# Altium footprint library Connectors.PcbLib: 135 footprints (part 7 of 9)
Each footprint in its own frame and in the unit in brackets; x right, y up, seen from the top. Pads: shape width x height; smd on the part's side, far side on the other; paste and mask are expansions set on the pad; w line width, h text height; cw(c..) or ccw(c..) is an arc to the next point about the centre after c.
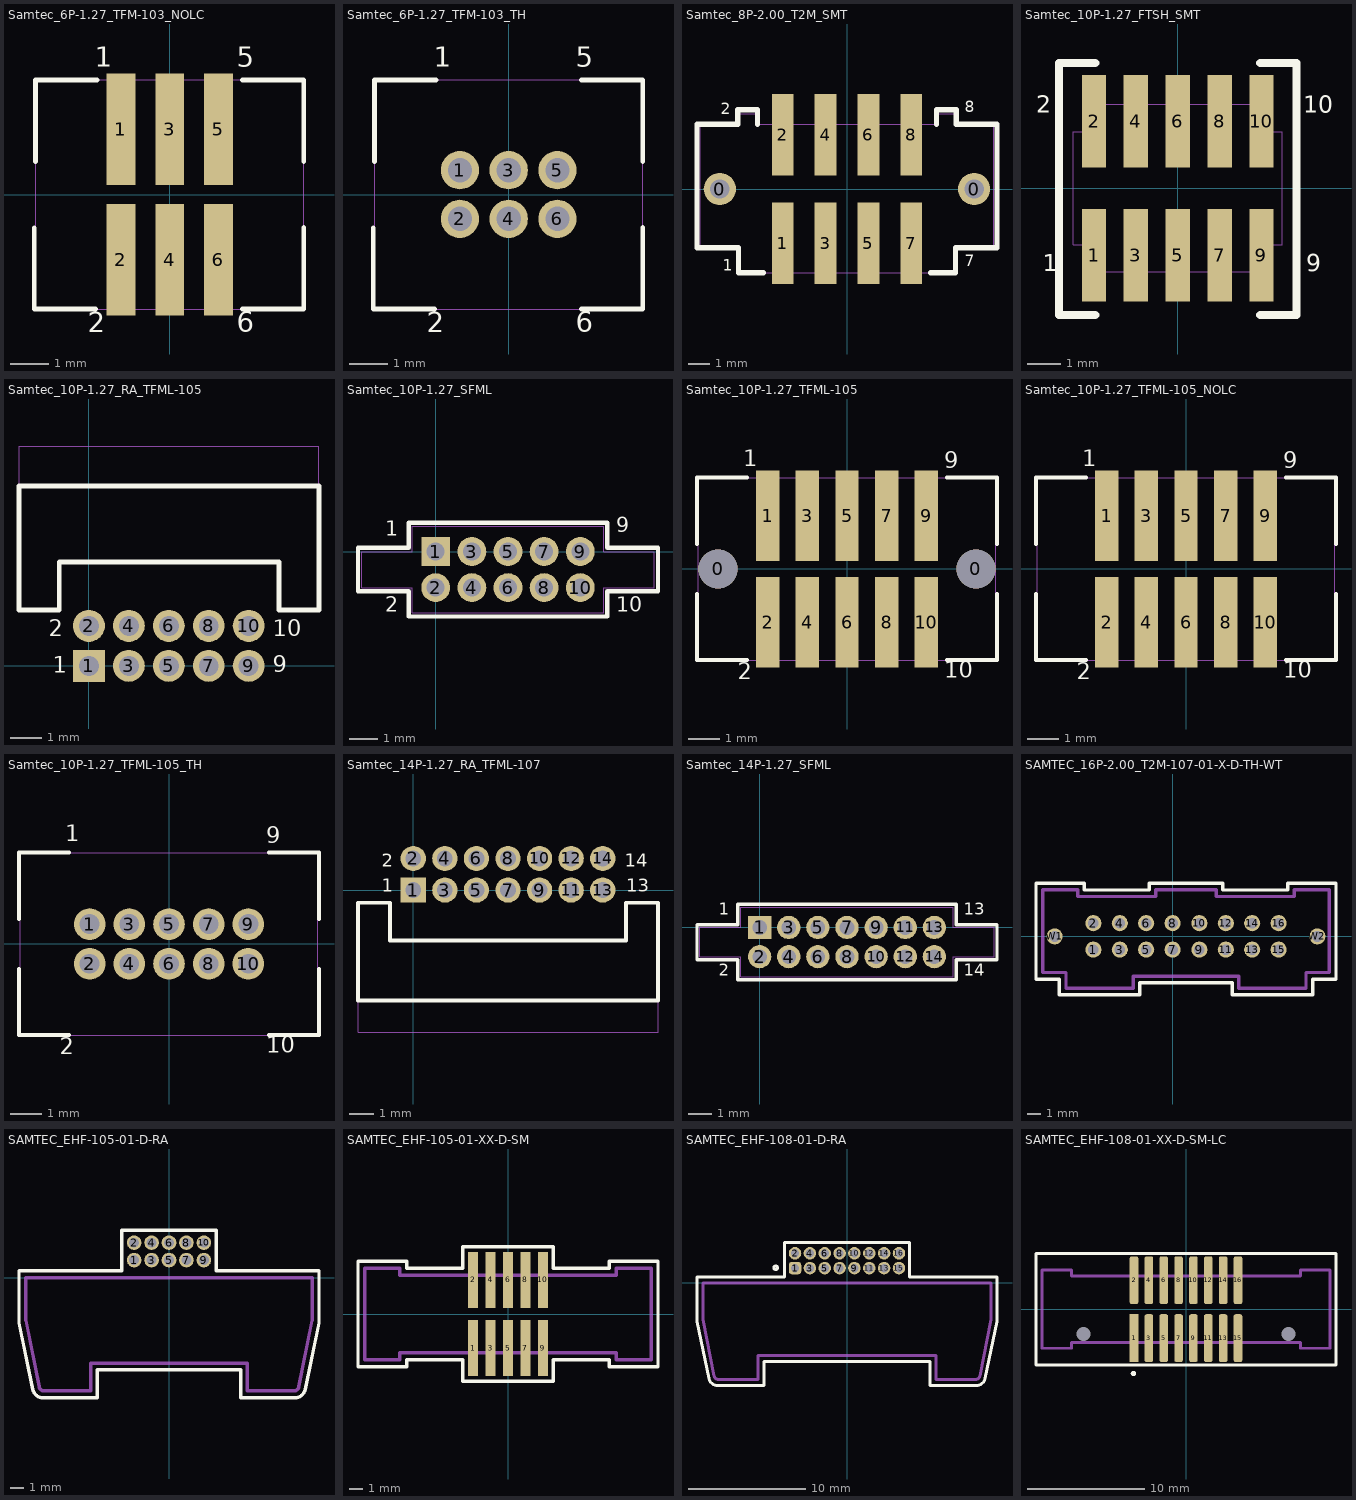
[diagram p6: the footprints below, top view; thin cyan lines are the x and y axes]

## Samtec_6P-1.27_TFM-103_NOLC [mm] "Connector Header 6pos dual row 1.27mmp surface mount No locking clip"
height 4.572
pads (6):
  rect 0.75x2.9 smd: 1(-1.27,1.7) 2(-1.27,-1.7) 3(0,1.7) 4(0,-1.7) 5(1.27,1.7) 6(1.27,-1.7)
Top Overlay:
  lines w0.127: -3.53,-0.864 -3.53,-2.985 -1.93,-2.985 ; -3.492,0.864 -3.492,2.985 -1.892,2.985 ; 1.893,-2.984 3.493,-2.984 3.493,-0.863 ; 1.893,2.985 3.493,2.985 3.493,0.864
  text "1" at -1.947,3.152 h0.9
  text "5" at 1.74,3.143 h0.9
  text "6" at 1.74,-3.751 h0.9
  text "2" at -2.13,-3.764 h0.9
Mechanical 1:
  lines w0.025: -3.492,-2.984 -3.492,2.985 3.493,2.985 3.493,-2.984 -3.492,-2.984
  text "2" at -2.148,-3.788 h1
  text "6" at 1.74,-3.751 h1
  text "5" at 1.74,3.143 h1
  text "1" at -1.947,3.152 h1
  text ".Designator" at -1.2,-0.3 h1.52
3D body "Samtec-TFM-103-02-L-D-LC.stp": height 5.59, standoff -1.27, extent -3.492,-2.984 3.493,2.985

## Samtec_6P-1.27_TFM-103_TH [mm] "Connector Header 6pos dual row 1.27mmp Through Hole No Locking clip"
height 4.572
pads (6):
  round 1 hole 0.635: 1(-1.27,0.635) 2(-1.27,-0.635) 3(0,0.635) 4(0,-0.635) 5(1.27,0.635) 6(1.27,-0.635)
Top Overlay:
  lines w0.127: -3.53,-0.864 -3.53,-2.985 -1.93,-2.985 ; -3.492,0.864 -3.492,2.985 -1.892,2.985 ; 1.893,-2.984 3.493,-2.984 3.493,-0.863 ; 1.893,2.985 3.493,2.985 3.493,0.864
  text "2" at -2.13,-3.764 h0.9
  text "6" at 1.74,-3.751 h0.9
  text "5" at 1.74,3.143 h0.9
  text "1" at -1.947,3.152 h0.9
Mechanical 1:
  lines w0.025: -3.492,-2.984 3.493,-2.984 3.493,2.985 -3.492,2.985 -3.492,-2.984
  text ".Designator" at -1.2,-0.3 h1.52
  text "1" at -1.947,3.152 h1
  text "5" at 1.74,3.143 h1
  text "6" at 1.74,-3.751 h1
  text "2" at -2.148,-3.788 h1
3D body "Samtec-TFM-103-01-L-D.stp": height 5.59, standoff -1.98, extent -3.492,-2.857 3.493,2.858

## Samtec_8P-2.00_T2M_SMT [mm] "Connector Header 8pos dual row 2.0mmp SMT"
height 4.572
pads (10):
  round 1.5 hole 0.9: 0(-5.935,0) 0(5.935,0)
  rect 1.02x3.8 smd: 1(-3,-2.535) 2(-3,2.535) 3(-1,-2.535) 4(-1,2.535) 5(1,-2.535) 6(1,2.535) 7(3,-2.535) 8(3,2.535)
Top Overlay:
  lines w0.25: -4.177,3.015 -4.177,3.7 -5.1,3.7 -5.1,3.015 -7,3.015 -7,-2.735 -5.065,-2.735 -5.065,-3.915 -3.9,-3.915 ; 3.9,-3.915 5.065,-3.915 5.065,-2.735 7,-2.735 7,3.015 5.1,3.015 5.1,3.7 4.177,3.7 4.177,3.015
  text "2" at -5.9,3.3 h0.9
  text "8" at 5.5,3.4 h0.9
  text "7" at 5.5,-3.8 h0.9
  text "1" at -5.8,-4 h0.9
Mechanical 1:
  lines w0.025: -6.837,-2.735 -6.837,3.015 -5.066,3.015 -5.066,3.523 -4.177,3.523 -4.177,3.015 4.177,3.015 4.177,3.523 5.066,3.523 5.066,3.015 6.837,3.015 6.837,-2.735 5.064,-2.735 5.064,-3.915 -5.065,-3.915 -5.065,-2.735 -6.837,-2.735 ; -3.3,-4.2 -2.7,-4.2 -2.7,-0.9 -3.3,-0.9 -3.3,-4.2 ; -3.3,0.87 -3.3,4.17 -2.7,4.17 -2.7,0.87 -3.3,0.87 ; -1.3,-4.2 -1.3,-0.9 -0.7,-0.9 -0.7,-4.2 -1.3,-4.2 ; -1.3,0.87 -1.3,4.17 -0.7,4.17 -0.7,0.87 -1.3,0.87 ; 0.7,-4.2 0.7,-0.9 1.3,-0.9 1.3,-4.2 0.7,-4.2 ; 0.7,0.87 0.7,4.17 1.3,4.17 1.3,0.87 0.7,0.87 ; 2.7,-4.2 2.7,-0.9 3.3,-0.9 3.3,-4.2 2.7,-4.2 ; 2.7,0.87 2.7,4.17 3.3,4.17 3.3,0.87 2.7,0.87
  text ".Designator" at -2.3,-0.6 h1
  text "1" at -4.2,-2.8 h1
  text "7" at 3.8,-2.8 h1
  text "8" at 3.7,2.2 h1
  text "2" at -4.2,2.1 h1
3D body "Samtec-T2M-104-01-L-D-SM-K-TR-WT.stp": height 6.68, standoff -1.65, extent -6.837,-4.313 6.837,4.314

## Samtec_10P-1.27_FTSH_SMT [mm] "Connector Header 10pos dual row 1.27mmp SMT"
height 4.572
pads (10):
  rect 0.74x2.8 smd: 1(-2.54,-2.03) 2(-2.54,2.03) 3(-1.27,-2.03) 4(-1.27,2.03) 5(0,-2.03) 6(0,2.03) 7(1.27,-2.03) 8(1.27,2.03) 9(2.54,-2.03) 10(2.54,2.03)
Top Overlay:
  lines w0.25: -2.5,-3.85 -3.6,-3.85 -3.6,3.8 -2.5,3.8 ; 2.5,-3.85 3.6,-3.85 3.6,3.8 2.5,3.8
  text "1" at -4.1,-2.7 h0.9
  text "9" at 3.9,-2.7 h0.9
  text "10" at 3.8,2.1 h0.9
  text "2" at -4.3,2.1 h0.9
Mechanical 1:
  lines w0.025: -3.175,-1.715 -2.54,-1.715 -2.54,-2.54 2.54,-2.54 2.54,-1.715 3.175,-1.715 3.175,1.714 2.54,1.714 2.54,2.54 -2.54,2.54 -2.54,1.714 -3.175,1.714 -3.175,-1.715 ; -2.8,-2.77 -2.8,-1.07 -2.3,-1.07 -2.3,-2.77 -2.8,-2.77 ; -2.8,1.07 -2.3,1.07 -2.3,2.77 -2.8,2.77 -2.8,1.07 ; -1.53,-2.77 -1.03,-2.77 -1.03,-1.07 -1.53,-1.07 -1.53,-2.77 ; -1.53,1.07 -1.53,2.77 -1.03,2.77 -1.03,1.07 -1.53,1.07 ; -0.26,-2.77 0.24,-2.77 0.24,-1.07 -0.26,-1.07 -0.26,-2.77 ; -0.26,1.07 -0.26,2.77 0.24,2.77 0.24,1.07 -0.26,1.07 ; 1.01,-2.77 1.51,-2.77 1.51,-1.07 1.01,-1.07 1.01,-2.77 ; 1.01,1.07 1.01,2.77 1.51,2.77 1.51,1.07 1.01,1.07 ; 2.28,-2.77 2.78,-2.77 2.78,-1.07 2.28,-1.07 2.28,-2.77 ; 2.28,1.07 2.28,2.77 2.78,2.77 2.78,1.07 2.28,1.07
  text "2" at -3.4,2.03 h1
  text "10" at 3,1.9 h1
  text "9" at 3.1,-2.7 h1
  text "1" at -3.2,-2.7 h1
  text ".Designator" at -0.8,-0.1 h1
3D body "Samtec-FTSH-105-01-L-DV-K.stp": height 6.12, standoff 0, extent -3.175,-2.921 3.175,2.921

## Samtec_10P-1.27_RA_TFML-105 [mil] "Connector Header 10pos dual row 1.27mmp through hole"
height 433.07
pads (10):
  rect 40x40 hole 25: 1(0,0)
  round 40 hole 25: 2(0,50) 3(50,0) 4(50,50) 5(100,0) 6(100,50) 7(150,0) 8(150,50) 9(200,0) 10(200,50)
Top Overlay:
  lines w6: -87.5,70 -37,70 -37,130 238,130 238,70 288,70 288,225 -87.5,225 -87.5,70
  text "2" at -50,30 h35.43
  text "10" at 230,30 h35.43
  text "9" at 230,-15 h35.43
  text "1" at -45,-15.39 h35.43
Mechanical 1:
  circle w1: c0,0 r12.5
  circle w1: c50,0 r12.5
  circle w1: c100,0 r12.5
  circle w1: c150,0.01 r12.5
  circle w1: c200,0.01 r12.5
  circle w1: c0,50 r12.5
  circle w1: c200,50.01 r12.5
  circle w1: c150,50.01 r12.5
  circle w1: c100,50 r12.5
  circle w1: c50,50 r12.5
  lines w1: -87.5,70 -37,70 -37,130 238,130 238,70 288,70 288,275 -87.5,275 -87.5,70
  text ".Designator" at 30,150 h60
  text "1" at -50,-15.39 h39.37
  text "9" at 230,-15 h39.37
  text "10" at 230,30 h39.37
  text "2" at -50,35 h39.37
3D body "Samtec-TFML-05-01-L-D-RA.SLDPRT": height 225, standoff -75, extent -87.49,-4.98 287.51,290.02

## Samtec_10P-1.27_SFML [mil] "Connector Header 10pos dual row 1.27mmp through hole"
height 180
pads (10):
  rect 40x40 hole 25: 1(0,0)
  round 40 hole 25: 2(0,-50) 3(50,0) 4(50,-50) 5(100,0) 6(100,-50) 7(150,0) 8(150,-50) 9(200,0) 10(200,-50)
Top Overlay:
  lines w6: -107.5,-55 -107.5,5 -37.5,5 -37.5,40 237.5,40 237.5,5 307.5,5 307.5,-55 237.5,-55 237.5,-90 -37.5,-90 -37.5,-55 -107.5,-55
  text "1" at -69.97,15 h35.43
  text "9" at 250,20 h35.43
  text "10" at 250,-90 h35.43
  text "2" at -70,-90 h35.43
Mechanical 1:
  circle w1: c50,-50 r12.5
  circle w1: c100,-50 r12.5
  circle w1: c150,-49.99 r12.5
  circle w1: c200,-49.99 r12.5
  circle w1: c0,-50 r12.5
  circle w1: c200,0.01 r12.5
  circle w1: c150,0.01 r12.5
  circle w1: c100,0 r12.5
  circle w1: c50,0 r12.5
  circle w1: c0,0 r12.5
  lines w1: -102.5,-50 -32.5,-50 -32.5,-85 232.5,-85 232.5,-50 302.5,-50 302.5,0 232.5,0 232.5,35 -32.5,35 -32.5,0 -102.5,0 -102.5,-50
  text "2" at -70,-85 h39.37
  text "10" at 250,-90 h39.37
  text "9" at 250,20 h39.37
  text "1" at -69.96,15 h39.37
  text ".Designator" at 65,60 h60
3D body "Samtec-SFML-05-01-L-D.step": height 180, standoff -119.98, extent -102.49,-111.99 302.51,35.01

## Samtec_10P-1.27_TFML-105 [mm] "Connector Header 10pos dual row 1.27mmp surface mount"
height 4.572
pads (12):
  round 1.25 hole 1.25 unplated paste-1.25: 0(-4.128,0) 0(4.127,0)
  rect 0.75x2.9 smd: 1(-2.54,1.7) 2(-2.54,-1.7) 3(-1.27,1.7) 4(-1.27,-1.7) 5(0,1.7) 6(0,-1.7) 7(1.27,1.7) 8(1.27,-1.7) 9(2.54,1.7) 10(2.54,-1.7)
Top Overlay:
  lines w0.127: -4.8,-0.8 -4.8,-2.921 -3.2,-2.921 ; -4.8,0.8 -4.8,2.921 -3.2,2.921 ; 3.2,-2.921 4.8,-2.921 4.8,-0.8 ; 3.2,2.921 4.8,2.921 4.8,0.8
  text "2" at -3.5,-3.7 h0.9
  text "10" at 3.11,-3.651 h0.9
  text "9" at 3.11,3.043 h0.9
  text "1" at -3.317,3.116 h0.9
Mechanical 1:
  circle w0.025: c4.127,0 r0.343
  circle w0.025: c-4.128,0 r0.343
  lines w0.025: -4.762,-2.921 4.763,-2.921 4.763,2.921 -4.762,2.921 -4.762,-2.921
  text ".Designator" at -1.4,-0.4 h1.52
  text "1" at -3.317,3.116 h1
  text "9" at 3.11,3.043 h1
  text "10" at 3.11,-3.651 h1
  text "2" at -3.518,-3.724 h1
3D body "Samtec-TFML-105-02-S-D-LC.stp": height 5.59, standoff -1.27, extent -4.762,-2.921 4.763,2.921

## Samtec_10P-1.27_TFML-105_NOLC [mm] "Connector Header 10pos dual row 1.27mmp surface mount No Locking Clip"
height 4.572
pads (10):
  rect 0.75x2.9 smd: 1(-2.54,1.7) 2(-2.54,-1.7) 3(-1.27,1.7) 4(-1.27,-1.7) 5(0,1.7) 6(0,-1.7) 7(1.27,1.7) 8(1.27,-1.7) 9(2.54,1.7) 10(2.54,-1.7)
Top Overlay:
  lines w0.127: -4.8,-0.8 -4.8,-2.921 -3.2,-2.921 ; -4.8,0.8 -4.8,2.921 -3.2,2.921 ; 3.2,-2.921 4.8,-2.921 4.8,-0.8 ; 3.2,2.921 4.8,2.921 4.8,0.8
  text "2" at -3.5,-3.7 h0.9
  text "10" at 3.11,-3.651 h0.9
  text "9" at 3.11,3.043 h0.9
  text "1" at -3.317,3.116 h0.9
Mechanical 1:
  lines w0.025: -4.762,-2.921 4.763,-2.921 4.763,2.921 -4.762,2.921 -4.762,-2.921
  text ".Designator" at -1.4,-0.4 h1.52
  text "1" at -3.317,3.116 h1
  text "9" at 3.11,3.043 h1
  text "10" at 3.11,-3.651 h1
  text "2" at -3.518,-3.724 h1
3D body "Samtec-TFML-105-02-S-D-LC.stp": height 5.59, standoff -1.27, extent -4.762,-2.921 4.763,2.921

## Samtec_10P-1.27_TFML-105_TH [mil] "Connector Header 10pos dual row 1.27mmp Through Hole No Locking Clip"
height 180
pads (10):
  round 40 hole 25: 1(-100,25) 2(-100,-25) 3(-50,25) 4(-50,-25) 5(0,25) 6(0,-25) 7(50,25) 8(50,-25) 9(100,25) 10(100,-25)
Top Overlay:
  lines w5: -188.98,-31.5 -188.98,-115 -125.98,-115 ; -188.98,31.5 -188.98,115 -125.98,115 ; 125.98,-115 188.98,-115 188.98,-31.5 ; 125.98,115 188.98,115 188.98,31.5
  text "2" at -137.8,-145.67 h35.43
  text "10" at 122.44,-143.74 h35.43
  text "9" at 122.44,119.8 h35.43
  text "1" at -130.6,122.68 h35.43
Mechanical 1:
  lines w1: -187.49,-114.99 187.51,-114.99 187.51,115 -187.49,115 -187.49,-114.99
  text ".Designator" at -55.12,-15.75 h60
  text "1" at -130.59,122.68 h39.37
  text "9" at 122.44,119.8 h39.37
  text "10" at 122.44,-143.74 h39.37
  text "2" at -138.5,-146.61 h39.37
3D body "Samtec-TFML-105-01-S-D.stp": height 220, standoff -75, extent -187.49,-112.49 187.51,112.51

## Samtec_14P-1.27_RA_TFML-107 [mil] "Connector Header 14pos dual row 1.27mmp through hole"
height 433.07
pads (14):
  rect 40x40 hole 25 mask+2: 1(0,0)
  round 40 hole 25 mask+2: 2(0,50) 3(50,0) 4(50,50) 5(100,0) 6(100,50) 7(150,0) 8(150,50) 9(200,0) 10(200,50) 11(250,0) 12(250,50) 13(300,0) 14(300,50)
Top Overlay:
  lines w6: -87.5,-175 -87.5,-20 -37,-20 -37,-80 337,-80 337,-20 387.5,-20 387.5,-175 -87.5,-175
  text "2" at -50,30 h35.43
  text "14" at 335,30 h35.43
  text "13" at 337,-10 h35.43
  text "1" at -50,-10 h35.43
Mechanical 1:
  circle w1: c0,0 r12.5
  circle w1: c50,0 r12.5
  circle w1: c100,0 r12.5
  circle w1: c150,0.01 r12.5
  circle w1: c200,0.01 r12.5
  circle w1: c0,50 r12.5
  circle w1: c200,50.01 r12.5
  circle w1: c150,50.01 r12.5
  circle w1: c100,50 r12.5
  circle w1: c50,50 r12.5
  circle w1: c250,50.01 r12.5
  circle w1: c250,0.01 r12.5
  circle w1: c300,50.01 r12.5
  circle w1: c300,0.01 r12.5
  lines w1: -87.5,-20 -37,-20 ; -87.5,-20 -37,-20 ; -87.5,-20 -87.5,-225 387.5,-225 387.5,-20 ; -37,-80 337,-80 ; -37,-80 -37,-20 ; -37,-80 337,-80 ; -37,-80 -37,-20 ; 337,-80 337,-20 ; 337,-80 337,-20 ; 337,-20 387.5,-20 ; 337,-20 387.5,-20
  text ".Designator" at 15,-95 h60
  text "1" at -50,-15.39 h39.37
  text "13" at 335,-15 h39.37
  text "14" at 335,30 h39.37
  text "2" at -50,35 h39.37
3D body "Samtec-TFML-07-01-S-D-RA.step": height 225, standoff -75, extent -87.5,-238.66 387.5,56.34

## Samtec_14P-1.27_SFML [mil] "Connector Header 14pos dual row 1.27mmp through hole"
height 180
pads (14):
  rect 40x40 hole 25: 1(0,0)
  round 40 hole 25: 2(0,-50) 3(50,0) 4(50,-50) 5(100,0) 6(100,-50) 7(150,0) 8(150,-50) 9(200,0) 10(200,-50) 11(250,0) 12(250,-50) 13(300,0) 14(300,-50)
Top Overlay:
  lines w6: -107.5,-55 -37.5,-55 -37.5,-90 337.5,-90 337.5,-55 407.5,-55 407.5,5 337.5,5 337.5,40 -37.5,40 -37.5,5 -107.5,5 -107.5,-55
  text "2" at -70,-90 h35.43
  text "14" at 350,-90 h35.43
  text "13" at 350,15 h35.43
  text "1" at -69.97,15 h35.43
Mechanical 1:
  circle w1: c0,0 r12.5
  circle w1: c50,0 r12.5
  circle w1: c100,0 r12.5
  circle w1: c150,0.01 r12.5
  circle w1: c200,0.01 r12.5
  circle w1: c0,-50 r12.5
  circle w1: c200,-49.99 r12.5
  circle w1: c150,-49.99 r12.5
  circle w1: c100,-50 r12.5
  circle w1: c50,-50 r12.5
  circle w1: c250,-49.99 r12.5
  circle w1: c250,0.01 r12.5
  circle w1: c300,-49.99 r12.5
  circle w1: c300,0.01 r12.5
  lines w1: -102.5,-50 -102.5,0 -32.5,0 -32.5,35 332.5,35 332.5,0 402.5,0 402.5,-50 332.5,-50 332.5,-85 -32.5,-85 -32.5,-50 -102.5,-50
  text ".Designator" at 65,60 h60
  text "1" at -69.96,15 h39.37
  text "13" at 350,15 h39.37
  text "14" at 350,-90 h39.37
  text "2" at -70,-85 h39.37
3D body "Samtec-SFML-07-01-L-D.step": height 180, standoff -119.98, extent -102.32,-111.99 402.68,35.01

## SAMTEC_16P-2.00_T2M-107-01-X-D-TH-WT [mm]
pads (18):
  round 1.22 hole 0.813 mask+0.075: 1(-6,-1) 2(-6,1) 3(-4,-1) 4(-4,1) 5(-2,-1) 6(-2,1) 7(0,-1) 8(0,1) 9(2.02,-1) 10(2.02,1) 11(4.02,-1) 12(4.02,1) 13(6.02,-1) 14(6.02,1) 15(8.02,-1) 16(8.02,1) W1(-8.925,0) W2(10.945,0)
Top Overlay:
  lines w0.254: -10.337,-3.235 -8.565,-3.235 -8.565,-4.415 -2.484,-4.415 -2.484,-3.515 4.504,-3.515 4.504,-4.415 10.585,-4.415 10.585,-3.235 12.357,-3.235 12.357,4.023 8.696,4.023 8.696,3.515 3.79,3.515 3.79,4.023 -1.77,4.023 -1.77,3.515 -6.676,3.515 -6.676,4.023 -10.337,4.023 -10.337,-3.235
Mechanical 1:
  lines w0.254: -9.837,-2.735 -8.065,-2.735 -8.065,-3.915 -2.984,-3.915 -2.984,-3.015 5.004,-3.015 5.004,-3.915 10.085,-3.915 10.085,-2.735 11.857,-2.735 11.857,3.523 9.196,3.523 9.196,3.015 3.29,3.015 3.29,3.523 -1.27,3.523 -1.27,3.015 -7.176,3.015 -7.176,3.523 -9.837,3.523 -9.837,-2.735
  text ".Designator" at -1.3,-0.476 h1.52
3D body "Samtec-T2M-108-01-L-D-TH-WT.stp": height 5.79, standoff -2.97, extent -9.827,-3.915 11.847,3.523

## SAMTEC_EHF-105-01-D-RA [mil]
pads (10):
  round 42 hole 28 mask+3: 1(-100,50) 2(-100,100) 3(-50,50) 4(-50,100) 5(0,50) 6(0,100) 7(50,50) 8(50,100) 9(100,50) 10(100,100)
Top Overlay:
  lines w10: -430,-130 -430,20 -136,20 -136,136 136,136 136,20 430,20 430,-130 390.08,-321.29 cw(c360.75,-315) 360.75,-345 205,-345 205,-265 -205,-265 -205,-345 -360.75,-345 cw(c-360.75,-315) -390.08,-321.29 -430,-130
Mechanical 1:
  lines w10: 357.67,-325 ccw(c357.67,-310) 372.39,-312.91 410,-123 410,0 -410,0 -410,-123 -372.39,-312.91 ccw(c-357.68,-310) -357.68,-325 -225,-325 -225,-245 225,-245 225,-325 357.68,-325
  text "J1" at -17.57,-108 h30

## SAMTEC_EHF-105-01-XX-D-SM [mil]
pads (10):
  rect 29x161 smd mask+2: 1(-100,-97.5) 2(-100,97.5) 3(-50,-97.5) 4(-50,97.5) 5(0,-97.5) 6(0,97.5) 7(50,-97.5) 8(50,97.5) 9(100,-97.5) 10(100,97.5)
Top Overlay:
  lines w10: -430,-151.5 -430,151.5 -290,151.5 -290,131.5 -130,131.5 -130,193 130,193 130,131.5 290,131.5 290,151.5 430,151.5 430,-151.5 290,-151.5 290,-131.5 130,-131.5 130,-193 -130,-193 -130,-131.5 -290,-131.5 -290,-151.5 -430,-151.5
Mechanical 1:
  lines w10: -410,-131.5 -410,131.5 -310,131.5 -310,111.5 310,111.5 310,131.5 410,131.5 410,-131.5 310,-131.5 310,-111.5 -310,-111.5 -310,-131.5 -410,-131.5
  text "J1" at -17.57,-18 h30

## SAMTEC_EHF-108-01-D-RA [mil]
pads (16):
  rrect50% 42x42 hole 28 mask+3: 1(-175,50)
  round 42 hole 28 mask+3: 2(-175,100) 3(-125,50) 4(-125,100) 5(-75,50) 6(-75,100) 7(-25,50) 8(-25,100) 9(25,50) 10(25,100) 11(75,50) 12(75,100) 13(125,50) 14(125,100) 15(175,50) 16(175,100)
Top Overlay:
  circle w10: c-240.16,51.18 r6
  lines w10: -505,-130 -505,20 -211,20 -211,136 211,136 211,20 505,20 505,-130 465.08,-321.29 cw(c435.75,-315) 435.75,-345 280,-345 280,-265 -280,-265 -280,-345 -435.75,-345 cw(c-435.75,-315) -465.08,-321.29 -505,-130
Mechanical 1:
  lines w10: -485,-123 -485,0 485,0 485,-123 447.39,-312.91 cw(c432.68,-310) 432.68,-325 300,-325 300,-245 -300,-245 -300,-325 -432.68,-325 cw(c-432.68,-310) -447.39,-312.91 -485,-123
  text "J1" at -17.57,-108 h30
3D body "EHF-108-01-F-D-RA.stp": height 266.5, standoff -86.5, extent -484.99,-444.99 485,108.01

## SAMTEC_EHF-108-01-XX-D-SM-LC [mil]
pads (18):
  rect 29x161 smd mask+2: 1(-175,-97.5)
  rrect50% 29x161 smd mask+2: 2(-175,97.5) 3(-125,-97.5) 4(-125,97.5) 5(-75,-97.5) 6(-75,97.5) 7(-25,-97.5) 8(-25,97.5) 9(25,-97.5) 10(25,97.5) 11(75,-97.5) 12(75,97.5) 13(125,-97.5) 14(125,97.5) 15(175,-97.5) 16(175,97.5)
  round 10 hole 47 unplated mask+28.5: 17(-345,-83) 18(345,-83)
Top Overlay:
  circle w10: c-177.17,-216.54 r3.94
  lines w10: -505,-188 -505,188 505,188 505,-188 -505,-188
Mechanical 1:
  lines w10: -485,-131.5 -485,131.5 -385,131.5 -385,111.5 385,111.5 385,131.5 485,131.5 485,-131.5 385,-131.5 385,-111.5 -385,-111.5 -385,-131.5 -485,-131.5
  text "J1" at -17.57,-18 h30
3D body "EHF-108-01-F-D-SM-LC.stp": height 455, standoff -50, extent -484,-148 486,148